# Altium footprint library LukaLIBRARY.PcbLib: 772 footprints (part 16 of 49)
Each footprint in its own frame and in the unit in brackets; x right, y up, seen from the top. Pads: shape width x height; smd on the part's side, far side on the other; paste and mask are expansions set on the pad; w line width, h text height; cw(c..) or ccw(c..) is an arc to the next point about the centre after c.
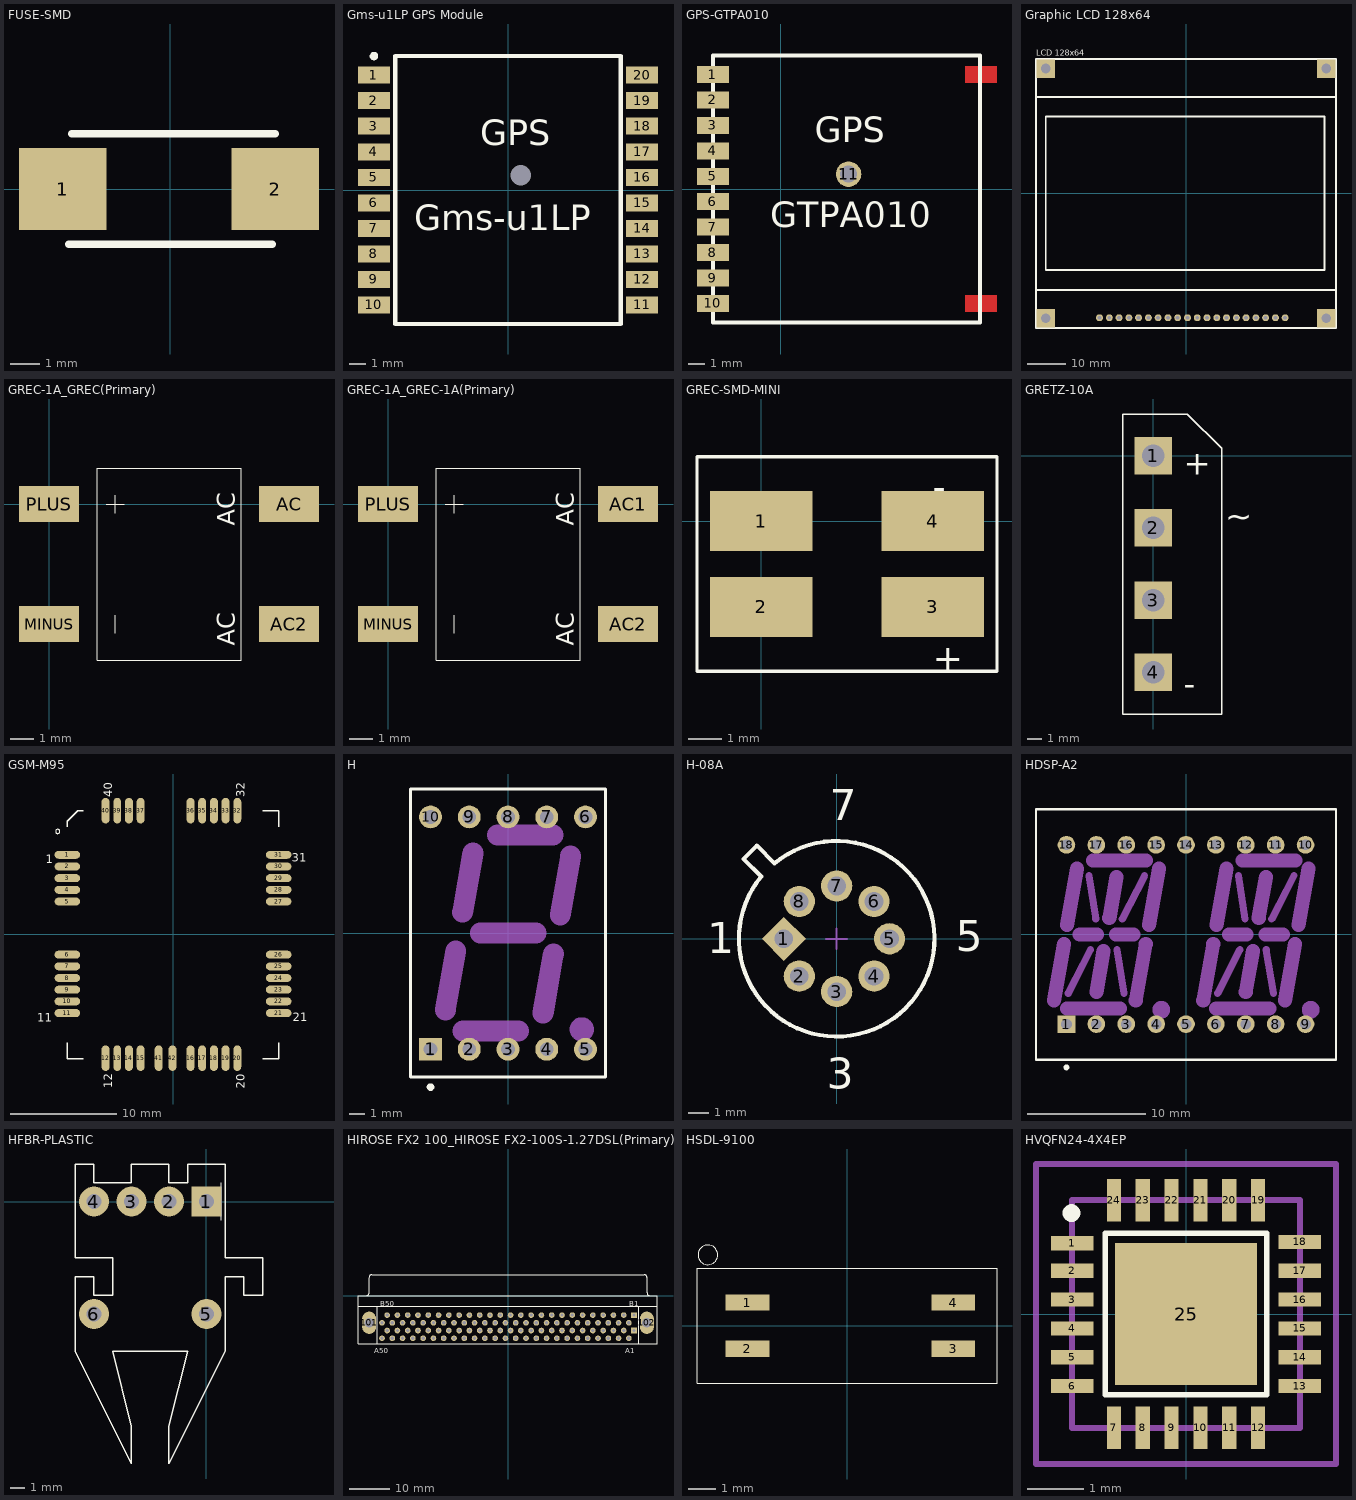
[diagram p15: the footprints below, top view; thin cyan lines are the x and y axes]

## FUSE-SMD [mm]
pads (2):
  rect 3x2.8 smd mask-25.4: 1(-3.7,0) 2(3.6,0)
Top Overlay:
  lines w0.25: -3.5,-1.9 3.5,-1.9 ; -3.4,1.9 3.6,1.9
Top Solder:
  region: -2.7,-1 -2.7,1 -4.7,1 -4.7,-1
  region: 4.6,-1 4.6,1 2.6,1 2.6,-1

## Gms-u1LP GPS Module [mil]
pads (21):
  rect 75x40 smd: 1(-315,270) 2(-315,210) 3(-315,150) 4(-315,90) 5(-315,30) 6(-315,-30) 7(-315,-90) 8(-315,-150) 9(-315,-210) 10(-315,-270) 11(315,-270) 12(315,-210) 13(315,-150) 14(315,-90) 15(315,-30) 16(315,30) 17(315,90) 18(315,150) 19(315,210) 20(315,270)
  round 0 hole 48: ""(30,35)
Top Overlay:
  lines w10: -320,315 ccw(c-315,315) -318.54,318.54 ; -265,-315 -265,315 265,315 265,-315 -265,-315
  text "Gms-u1LP" at -220,-95 h60
  text "GPS" at -65,105 h60

## GPS-GTPA010 [mil]
pads (11):
  rect 75x40 smd: 1(-160,270) 2(-160,210) 3(-160,150) 4(-160,90) 5(-160,30) 6(-160,-30) 7(-160,-90) 8(-160,-150) 9(-160,-210) 10(-160,-270)
  round 60 hole 40: 11(160,35)
Top Layer:
  rectangle: 435,-290 510,-250
  rectangle: 435,250 510,290
Top Overlay:
  lines w10: -160,-315 -160,315 470,315 470,-315 -160,-315
  text "GTPA010" at -25,-90 h60
  text "GPS" at 80,110 h60

## Graphic LCD 128x64 [mil]
pads (24):
  round 71 hole 40: 1(1015,-1272.5) 2(915,-1272.5) 3(815,-1272.5) 4(715,-1272.5) 5(615,-1272.5) 6(515,-1272.5) 7(415,-1272.5) 8(315,-1272.5) 9(215,-1272.5) 10(115,-1272.5) 11(15,-1272.5) 12(-85,-1272.5) 13(-185,-1272.5) 14(-285,-1272.5) 15(-385,-1272.5) 16(-485,-1272.5) 17(-585,-1272.5) 18(-685,-1272.5) 19(-785,-1272.5) 20(-885,-1272.5)
  rect 190x190 hole 99: ""(-1435,-1277.5) ""(-1435,1277.5) ""(1435,-1277.5) ""(1435,1277.5)
Top Overlay:
  lines w20: -1535,-987.5 1535,-987.5 ; -1535,987.5 1535,987.5 ; -1535,-1377.5 1535,-1377.5 1535,1377.5 -1535,1377.5 -1535,-1377.5 ; -1435,-782.5 -1435,787.5 1415,787.5 1415,-782.5 -1435,-782.5
  text "LCD 128x64" at -1535,1407.5 h60

## GREC-1A_GREC(Primary) [mil]
pads (4):
  rect 100x60 smd mask-1000: AC(400,0) AC2(400,-200) MINUS(0,-200) PLUS(0,0)
Top Overlay:
  lines w1: 80,-260 80,60 320,60 320,-260 80,-260
  lines w2: 95,0 125,0 ; 110,-215 110,-185 ; 110,-15 110,15
  text "AC" at 319.69,-235.94 h50
  text "AC" at 319.69,-35.94 h50
Top Solder:
  region: -50,-230 50,-230 50,-170 -50,-170
  region: 350,-230 450,-230 450,-170 350,-170
  region: -50,-30 50,-30 50,30 -50,30
  region: 350,-30 450,-30 450,30 350,30

## GREC-1A_GREC-1A(Primary) [mil]
pads (4):
  rect 100x60 smd mask-1000: AC1(400,0) AC2(400,-200) MINUS(0,-200) PLUS(0,0)
Top Overlay:
  lines w1: 80,-260 320,-260 320,60 80,60 80,-260
  lines w2: 95,0 125,0 ; 110,-215 110,-185 ; 110,-15 110,15
  text "AC" at 319.69,-35.94 h50
  text "AC" at 319.69,-235.94 h50
Top Solder:
  region: 350,-30 450,-30 450,30 350,30
  region: -50,-30 50,-30 50,30 -50,30
  region: 350,-230 450,-230 450,-170 350,-170
  region: -50,-230 50,-230 50,-170 -50,-170

## GREC-SMD-MINI [mil]
pads (4):
  rect 120x70 smd: 1(0,0) 2(0,-100) 3(200,-100) 4(200,0)
Top Overlay:
  lines w3.94: -75,-175 275,-175 275,75 -75,75 -75,-175
  text "-" at 200,25 h31.25
  text "+" at 200,-175 h31.25

## GRETZ-10A [mm]
pads (4):
  rect 2.5x2.5 hole 1.5: 1(0,0) 2(0,-4.826) 3(0,-9.652) 4(0,-14.478)
Top Overlay:
  lines w0.1: -2.032,-17.272 -2.032,2.794 2.286,2.794 4.572,0.508 4.572,-17.272 -2.032,-17.272
  text "-" at 2.032,-16.002 h1.59
  text "~" at 4.826,-4.826 h1.59
  text "+" at 2.032,-1.27 h1.59

## GSM-M95 [mm]
pads (42):
  oval 2.4x0.75 smd mask-25.4: 1(-9.95,7.5) 2(-9.95,6.4) 3(-9.95,5.3) 4(-9.95,4.2) 5(-9.95,3.1) 6(-9.95,-1.9) 7(-9.95,-3) 8(-9.95,-4.1) 9(-9.95,-5.2) 10(-9.95,-6.3) 11(-9.95,-7.4) 21(9.95,-7.4) 22(9.95,-6.3) 23(9.95,-5.2) 24(9.95,-4.1) 25(9.95,-3) 26(9.95,-1.9) 27(9.95,3.1) 28(9.95,4.2) 29(9.95,5.3) 30(9.95,6.4) 31(9.95,7.5)
  oval 0.75x2.4 smd mask-25.4: 12(-6.35,-11.65) 13(-5.25,-11.65) 14(-4.15,-11.65) 15(-3.05,-11.65) 16(1.65,-11.65) 17(2.75,-11.65) 18(3.85,-11.65) 19(4.95,-11.65) 20(6.05,-11.65) 32(6.05,11.65) 33(4.95,11.65) 34(3.85,11.65) 35(2.75,11.65) 36(1.65,11.65) 37(-3.05,11.65) 38(-4.15,11.65) 39(-5.25,11.65) 40(-6.35,11.65) 41(-1.35,-11.65) 42(-0.05,-11.65)
Top Overlay:
  circle w0.076: c-10.86,9.7 r0.2
  lines w0.127: -9.96,10.15 -9.96,10.65 ; -9.95,-10.19 -9.95,-11.69 -8.45,-11.69 ; -9.95,10.66 -8.95,11.66 -8.45,11.66 ; 8.45,-11.69 9.95,-11.69 9.95,-10.19 ; 8.45,11.66 9.95,11.66 9.95,10.16
  text "40" at -5.7,12.9 h0.79
  text "12" at -5.7,-14.5 h0.79
  text "21" at 11.25,-8.15 h0.79
  text "31" at 11.2,6.85 h0.79
  text "1" at -12,6.7 h0.79
  text "11" at -12.8,-8.2 h0.79
  text "32" at 6.75,12.9 h0.79
  text "20" at 6.75,-14.55 h0.79
Top Solder:
  drawing of 42 lines, arcs and shapes, not listed

## H [mm] "LED, 7-Segment Display, 14.2 mm, RHD; 10 Leads; Row Space 15.24 mm; Pitch 2.54 mm"
height 8.25
pads (10):
  rect 1.5x1.5 hole 0.9: 1(-5.08,-7.62)
  round 1.5 hole 0.9: 2(-2.54,-7.62) 3(0,-7.62) 4(2.54,-7.62) 5(5.08,-7.62) 6(5.08,7.62) 7(2.54,7.62) 8(0,7.62) 9(-2.54,7.62) 10(-5.08,7.62)
Top Overlay:
  circle w0.25: c-5.08,-10.1 r0.125
  lines w0.2: -6.4,-9.45 -6.4,9.45 6.4,9.45 6.4,-9.45 -6.4,-9.45
Mechanical 1:
  circle w1: c4.842,-6.316 r0.296
  lines w1.37: -4.108,-5.054 -3.425,-1.17 ; -2.974,1.368 -2.293,5.255 ; -2.958,-6.429 0.692,-6.426 ; -1.821,0 1.828,0 ; -0.689,6.425 2.96,6.425 ; 2.295,-5.256 2.98,-1.371 ; 3.427,1.169 4.11,5.058
Mechanical 13:
  lines w0.1: -6.4,-9.45 6.4,-9.45 6.4,9.45 -6.4,9.45 -6.4,-9.45
3D body: height 8.25, standoff 0, extent -6.4,-9.45 6.4,9.45

## H-08A [mm] "Can; 8 Leads; Pin Circle Dia. 5.08 mm; Lead Dia. 0.53 mm (max)"
height 4.7
pads (8):
  rect 1.5x1.5 hole 0.9 rot 45: 1(-2.54,0)
  round 1.5 hole 0.9: 2(-1.796,-1.796) 3(0,-2.54) 4(1.796,-1.796) 5(2.54,0) 6(1.796,1.796) 7(0,2.54) 8(-1.796,1.796)
Top Overlay:
  lines w0.2: -4.475,3.838 -3.626,2.99 ccw(c0,0) -2.99,3.626 -3.838,4.475 -4.475,3.838
  text "7" at -0.332,5.7 h1.5
  text "5" at 5.712,-0.589 h1.5
  text "3" at -0.469,-7.22 h1.5
  text "1" at -6.22,-0.696 h1.5
Mechanical 15:
  lines w0.1: -0.5,0 0.5,0 ; 0,-0.5 0,0.5

## HDSP-A2 [mm] "LED, Alphanumeric Display, 13.8 mm, Dual Character; 18 Leads; Row Space 15.24 mm; Pitch 2.54 mm"
height 7.27
pads (18):
  rect 1.5x1.5 hole 0.9: 1(-10.16,-7.62)
  round 1.5 hole 0.9: 2(-7.62,-7.62) 3(-5.08,-7.62) 4(-2.54,-7.62) 5(0,-7.62) 6(2.54,-7.62) 7(5.08,-7.62) 8(7.62,-7.62) 9(10.16,-7.62) 10(10.16,7.62) 11(7.62,7.62) 12(5.08,7.62) 13(2.54,7.62) 14(0,7.62) 15(-2.54,7.62) 16(-5.08,7.62) 17(-7.62,7.62) 18(-10.16,7.62)
Top Overlay:
  circle w0.25: c-10.16,-11.3 r0.125
  lines w0.2: -12.75,-10.65 -12.75,10.65 12.75,10.65 12.75,-10.65 -12.75,-10.65
Mechanical 1:
  circle w1.2: c10.6,-6.4 r0.15
  circle w1.2: c-2.1,-6.4 r0.15
  lines w0.6: -10.01,-5 -8.12,-1.3 ; -8.25,5 -7.67,1.3 ; -5.88,-1.3 -5.28,-5 ; -5.42,1.3 -3.52,5 ; 2.69,-5 4.58,-1.3 ; 4.45,5 5.03,1.3 ; 6.82,-1.3 7.42,-5 ; 7.28,1.3 9.18,5
  lines w1.2: -11.23,-5.6 -10.38,-0.8 ; -10.13,-6.3 -5.62,-6.3 ; -10.1,0.8 -9.26,5.58 ; -9.035,0 -7.58,0 ; -7.9,6.3 -3.39,6.3 ; -7.62,-4.89 -7.01,-1.4 ; -6.52,1.41 -5.91,4.89 ; -5.96,0 -4.465,0 ; -4.27,-5.6 -3.42,-0.8 ; -3.13,0.81 -2.3,5.59 ; 1.47,-5.6 2.32,-0.8 ; 2.57,-6.3 7.08,-6.3 ; 2.6,0.8 3.44,5.58 ; 3.665,0 5.14,0 ; 4.8,6.3 9.31,6.3 ; 5.08,-4.89 5.69,-1.4 ; 6.18,1.41 6.79,4.89 ; 6.76,0 8.235,0 ; 8.43,-5.6 9.28,-0.8 ; 9.57,0.81 10.4,5.59
Mechanical 13:
  lines w0.1: -12.75,-10.65 12.75,-10.65 12.75,10.65 -12.75,10.65 -12.75,-10.65
3D body: height 7.27, standoff 0, extent -12.75,-10.65 12.75,10.65

## HFBR-PLASTIC [mil]
pads (6):
  rect 80x80 hole 40 mask-1000: 1(0,0)
  round 80 hole 40 mask-1000: 2(-100,0) 3(-200,0) 4(-300,0) 5(0,-300) 6(-300,-300)
Top Overlay:
  lines w1: 40,-50 40,50
  lines w3.94: 50,-50 50,50 ; -350,-400 -350,-200 -300,-200 -300,-250 -250,-250 -250,-150 -350,-150 -350,100 -300,100 -300,50 -200,50 -200,100 -150,100 -100,100 -100,50 -50,50 -50,100 50,100 50,-150 150,-150 150,-250 100,-250 100,-200 50,-200 50,-400 -100,-700 -100,-600 -50,-400 -250,-400 -200,-600 -200,-700 -350,-400
Top Solder:
  region: -300,-40.35 -289.56,-38.97 -279.83,-34.94 -271.47,-28.53 -265.06,-20.17 -261.03,-10.44 -259.65,0 -261.03,10.44 -265.06,20.17 -271.47,28.53 -279.83,34.94 -289.56,38.97 -300,40.35 -310.44,38.97 -320.17,34.94 -328.53,28.53 -334.94,20.17 -338.97,10.44 -340.35,0 -338.97,-10.44 -334.94,-20.17 -328.53,-28.53 -320.17,-34.94 -310.44,-38.97
  region: -300,-340.35 -289.56,-338.97 -279.83,-334.94 -271.47,-328.53 -265.06,-320.17 -261.03,-310.44 -259.65,-300 -261.03,-289.56 -265.06,-279.83 -271.47,-271.47 -279.83,-265.06 -289.56,-261.03 -300,-259.65 -310.44,-261.03 -320.17,-265.06 -328.53,-271.47 -334.94,-279.83 -338.97,-289.56 -340.35,-300 -338.97,-310.44 -334.94,-320.17 -328.53,-328.53 -320.17,-334.94 -310.44,-338.97
  region: -100,-40.35 -89.56,-38.97 -79.83,-34.94 -71.47,-28.53 -65.06,-20.17 -61.03,-10.44 -59.65,0 -61.03,10.44 -65.06,20.17 -71.47,28.53 -79.83,34.94 -89.56,38.97 -100,40.35 -110.44,38.97 -120.17,34.94 -128.53,28.53 -134.94,20.17 -138.97,10.44 -140.35,0 -138.97,-10.44 -134.94,-20.17 -128.53,-28.53 -120.17,-34.94 -110.44,-38.97
  region: 40,40 -40,40 -40,-40 40,-40
  region: 0,-340.35 10.44,-338.97 20.17,-334.94 28.53,-328.53 34.94,-320.17 38.97,-310.44 40.35,-300 38.97,-289.56 34.94,-279.83 28.53,-271.47 20.17,-265.06 10.44,-261.03 0,-259.65 -10.44,-261.03 -20.17,-265.06 -28.53,-271.47 -34.94,-279.83 -38.97,-289.56 -40.35,-300 -38.97,-310.44 -34.94,-320.17 -28.53,-328.53 -20.17,-334.94 -10.44,-338.97
  region: -200,-40.35 -189.56,-38.97 -179.83,-34.94 -171.47,-28.53 -165.06,-20.17 -161.03,-10.44 -159.65,0 -161.03,10.44 -165.06,20.17 -171.47,28.53 -179.83,34.94 -189.56,38.97 -200,40.35 -210.44,38.97 -220.17,34.94 -228.53,28.53 -234.94,20.17 -238.97,10.44 -240.35,0 -238.97,-10.44 -234.94,-20.17 -228.53,-28.53 -220.17,-34.94 -210.44,-38.97
Bottom Solder:
  region: -300,-40.35 -289.56,-38.97 -279.83,-34.94 -271.47,-28.53 -265.06,-20.17 -261.03,-10.44 -259.65,0 -261.03,10.44 -265.06,20.17 -271.47,28.53 -279.83,34.94 -289.56,38.97 -300,40.35 -310.44,38.97 -320.17,34.94 -328.53,28.53 -334.94,20.17 -338.97,10.44 -340.35,0 -338.97,-10.44 -334.94,-20.17 -328.53,-28.53 -320.17,-34.94 -310.44,-38.97
  region: -300,-340.35 -289.56,-338.97 -279.83,-334.94 -271.47,-328.53 -265.06,-320.17 -261.03,-310.44 -259.65,-300 -261.03,-289.56 -265.06,-279.83 -271.47,-271.47 -279.83,-265.06 -289.56,-261.03 -300,-259.65 -310.44,-261.03 -320.17,-265.06 -328.53,-271.47 -334.94,-279.83 -338.97,-289.56 -340.35,-300 -338.97,-310.44 -334.94,-320.17 -328.53,-328.53 -320.17,-334.94 -310.44,-338.97
  region: -100,-40.35 -89.56,-38.97 -79.83,-34.94 -71.47,-28.53 -65.06,-20.17 -61.03,-10.44 -59.65,0 -61.03,10.44 -65.06,20.17 -71.47,28.53 -79.83,34.94 -89.56,38.97 -100,40.35 -110.44,38.97 -120.17,34.94 -128.53,28.53 -134.94,20.17 -138.97,10.44 -140.35,0 -138.97,-10.44 -134.94,-20.17 -128.53,-28.53 -120.17,-34.94 -110.44,-38.97
  region: 40,40 -40,40 -40,-40 40,-40
  region: 0,-340.35 10.44,-338.97 20.17,-334.94 28.53,-328.53 34.94,-320.17 38.97,-310.44 40.35,-300 38.97,-289.56 34.94,-279.83 28.53,-271.47 20.17,-265.06 10.44,-261.03 0,-259.65 -10.44,-261.03 -20.17,-265.06 -28.53,-271.47 -34.94,-279.83 -38.97,-289.56 -40.35,-300 -38.97,-310.44 -34.94,-320.17 -28.53,-328.53 -20.17,-334.94 -10.44,-338.97
  region: -200,-40.35 -189.56,-38.97 -179.83,-34.94 -171.47,-28.53 -165.06,-20.17 -161.03,-10.44 -159.65,0 -161.03,10.44 -165.06,20.17 -171.47,28.53 -179.83,34.94 -189.56,38.97 -200,40.35 -210.44,38.97 -220.17,34.94 -228.53,28.53 -234.94,20.17 -238.97,10.44 -240.35,0 -238.97,-10.44 -234.94,-20.17 -228.53,-28.53 -220.17,-34.94 -210.44,-38.97

## HIROSE FX2 100_HIROSE FX2-100S-1.27DSL(Primary) [mm]
pads (102):
  oval 3.467x5.5 hole 2.286: 101(-34.29,-6.69) 102(34.29,-6.69)
  rect 1.4x1.4 hole 0.8: A1(31.115,-8.595) B1(31.115,-4.785)
  round 1.4 hole 0.8: A2(29.845,-10.5) A3(28.575,-8.595) A4(27.305,-10.5) A5(26.035,-8.595) A6(24.765,-10.5) A7(23.495,-8.595) A8(22.225,-10.5) A9(20.955,-8.595) A10(19.685,-10.5) A11(18.415,-8.595) A12(17.145,-10.5) A13(15.875,-8.595) A14(14.605,-10.5) A15(13.335,-8.595) A16(12.065,-10.5) A17(10.795,-8.595) A18(9.525,-10.5) A19(8.255,-8.595) A20(6.985,-10.5) A21(5.715,-8.595) A22(4.445,-10.5) A23(3.175,-8.595) A24(1.905,-10.5) A25(0.635,-8.595) A26(-0.635,-10.5) A27(-1.905,-8.595) A28(-3.175,-10.5) A29(-4.445,-8.595) A30(-5.715,-10.5) A31(-6.985,-8.595) A32(-8.255,-10.5) A33(-9.525,-8.595) A34(-10.795,-10.5) A35(-12.065,-8.595) A36(-13.335,-10.5) A37(-14.605,-8.595) A38(-15.875,-10.5) A39(-17.145,-8.595) A40(-18.415,-10.5) A41(-19.685,-8.595) A42(-20.955,-10.5) A43(-22.225,-8.595) A44(-23.495,-10.5) A45(-24.765,-8.595) A46(-26.035,-10.5) A47(-27.305,-8.595) A48(-28.575,-10.5) A49(-29.845,-8.595) A50(-31.115,-10.5) B2(29.845,-6.69) B3(28.575,-4.785) B4(27.305,-6.69) B5(26.035,-4.785) B6(24.765,-6.69) B7(23.495,-4.785) B8(22.225,-6.69) B9(20.955,-4.785) B10(19.685,-6.69) B11(18.415,-4.785) B12(17.145,-6.69) B13(15.875,-4.785) B14(14.605,-6.69) B15(13.335,-4.785) B16(12.065,-6.69) B17(10.795,-4.785) B18(9.525,-6.69) B19(8.255,-4.785) B20(6.985,-6.69) B21(5.715,-4.785) B22(4.445,-6.69) B23(3.175,-4.785) B24(1.905,-6.69) B25(0.635,-4.785) B26(-0.635,-6.69) B27(-1.905,-4.785) B28(-3.175,-6.69) B29(-4.445,-4.785) B30(-5.715,-6.69) B31(-6.985,-4.785) B32(-8.255,-6.69) B33(-9.525,-4.785) B34(-10.795,-6.69) B35(-12.065,-4.785) B36(-13.335,-6.69) B37(-14.605,-4.785) B38(-15.875,-6.69) B39(-17.145,-4.785) B40(-18.415,-6.69) B41(-19.685,-4.785) B42(-20.955,-6.69) B43(-22.225,-4.785) B44(-23.495,-6.69) B45(-24.765,-4.785) B46(-26.035,-6.69) B47(-27.305,-4.785) B48(-28.575,-6.69) B49(-29.845,-4.785) B50(-31.115,-6.69)
Top Overlay:
  lines w0.2: -36.957,-11.811 36.83,-11.811 ; -36.957,-11.8 -36.957,0 36.83,0 ; -36.957,-2.54 36.83,-2.54 ; -35.01,0.005 ccw(c-35.01,0.7) -34.315,0.7 -34.315,4.5 ; -34.31,4.505 cw(c-33.615,4.505) -33.615,5.2 33.615,5.2 ; -32.24,-11.8 -32.24,-2.58 ; 32.24,-11.8 32.258,-2.54 ; 33.63,5.2 cw(c33.63,4.505) 34.325,4.505 ; 34.33,4.5 34.33,0.7 ccw(c35.025,0.7) 35.025,0.005 ; 36.868,-11.8 36.868,0
  text "B50" at -31.496,-2.54 h1.25
  text "B1" at 29.972,-2.54 h1.25
  text "A1" at 28.956,-14.224 h1.25
  text "A50" at -33.02,-14.224 h1.25

## HSDL-9100 [mm]
pads (4):
  rect 1.6x0.6 smd mask-25.4: 1(-3.65,0.85) 2(-3.65,-0.85) 3(3.9,-0.85) 4(3.9,0.85)
Top Overlay:
  circle w0.025: c-5.1,2.6 r0.361
  lines w0.025: -5.5,-2.1 -5.5,2.1 5.5,2.1 5.5,-2.1 -5.5,-2.1
Top Solder:
  region: -4.666,0.35 -2.634,0.35 -2.634,1.35 -4.666,1.35
  region: -4.666,-1.35 -2.634,-1.35 -2.634,-0.35 -4.666,-0.35
  region: 2.884,0.35 4.916,0.35 4.916,1.35 2.884,1.35
  region: 2.884,-1.35 4.916,-1.35 4.916,-0.35 2.884,-0.35

## HVQFN24-4X4EP [mm]
pads (25):
  rect 0.75x0.25 smd: 1(-2.007,1.245) 2(-2.007,0.762) 3(-2.007,0.254) 4(-2.007,-0.254) 5(-2.007,-0.762) 6(-2.007,-1.27) 13(2.007,-1.27) 14(2.007,-0.762) 15(2.007,-0.254) 16(2.007,0.254) 17(2.007,0.762) 18(2.007,1.27)
  rect 0.25x0.75 smd: 7(-1.27,-2.007) 8(-0.762,-2.007) 9(-0.254,-2.007) 10(0.254,-2.007) 11(0.762,-2.007) 12(1.27,-2.007) 19(1.27,2.007) 20(0.762,2.007) 21(0.254,2.007) 22(-0.254,2.007) 23(-0.762,2.007) 24(-1.27,2.007)
  rect 2.5x2.5 smd: 25(0,0)
Top Overlay:
  circle w0.25: c-2.017,1.778 r0.03
  lines w0.1: -1.422,-1.422 1.422,-1.422 1.422,1.422 -1.422,1.422 -1.422,-1.422
Mechanical 13:
  lines w0.1: -2.007,-2.007 -2.007,2.007 2.007,2.007 2.007,-2.007 -2.007,-2.007
Mechanical 15:
  lines w0.1: -2.642,-2.642 2.642,-2.642 2.642,2.642 -2.642,2.642 -2.642,-2.642